# Altium footprint library ThanhNT.PcbLib: 579 footprints (part 10 of 37)
Each footprint in its own frame and in the unit in brackets; x right, y up, seen from the top. Pads: shape width x height; smd on the part's side, far side on the other; paste and mask are expansions set on the pad; w line width, h text height; cw(c..) or ccw(c..) is an arc to the next point about the centre after c.
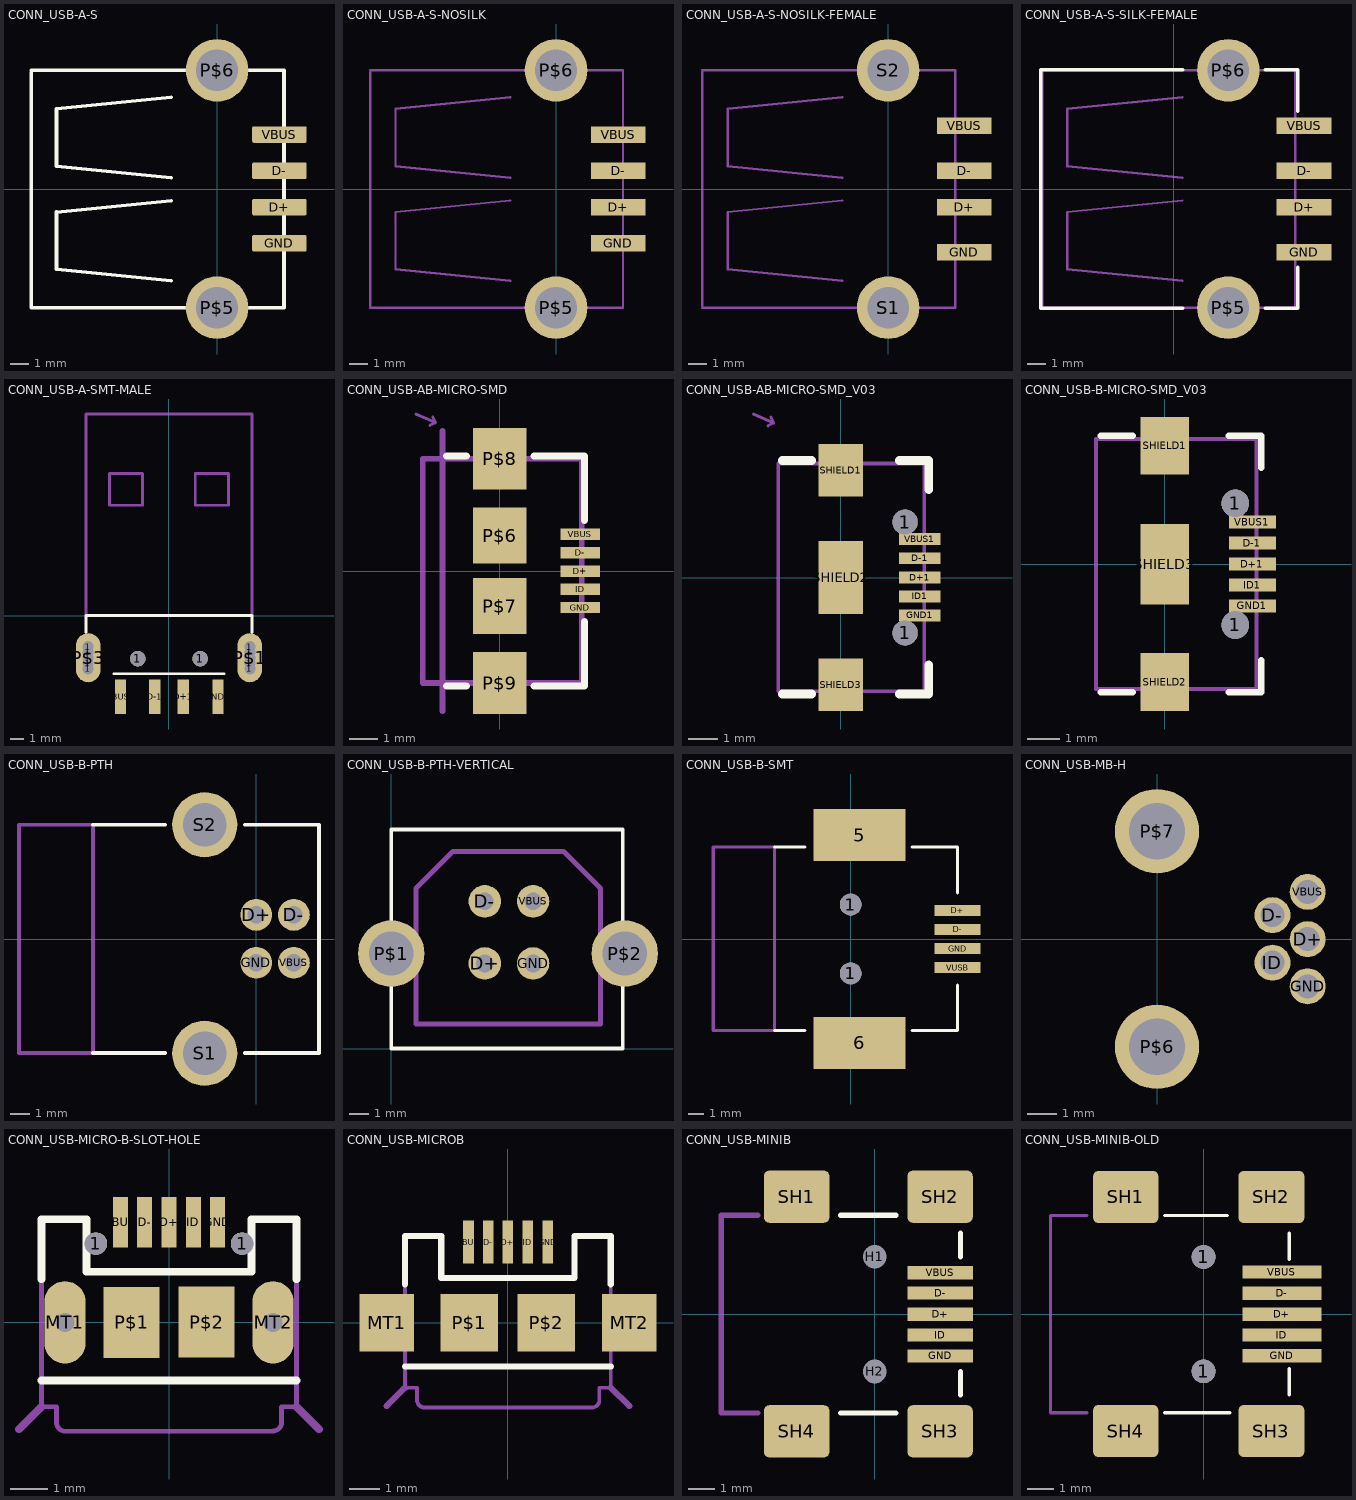
[diagram p9: the footprints below, top view; thin cyan lines are the x and y axes]

## CONN_USB-A-S [mil]
pads (6):
  rrect20% 119x36 smd: D+(136,-39.37) D-(136,40) GND(136,-118.11) VBUS(136,119)
  round 136.5 hole 91: P$5(0,-258.5) P$6(0,259)
Top Overlay:
  lines w7.87: -405,-258.5 146,-258.5 ; -405,-255 -405,255 ; -405,259 146,259 ; -100,-200 -350,-175 -350,-50 -100,-25 ; -100,25 -350,50 -350,175 -100,200 ; 146,-256 146,256

## CONN_USB-A-S-NOSILK [mil]
pads (6):
  rect 119x36 smd: D+(136,-39.37) D-(136,40) GND(136,-118.11) VBUS(136,119)
  round 136.5 hole 91: P$5(0,-258.5) P$6(0,259)
Mechanical 16:
  lines w5: -405,-258.5 146,-258.5 ; -405,-255 -405,255 ; -405,259 146,259 ; -100,-200 -350,-175 -350,-50 -100,-25 ; -100,25 -350,50 -350,175 -100,200 ; 146,-256 146,256

## CONN_USB-A-S-NOSILK-FEMALE [mil]
pads (6):
  rect 119x36 smd: D+(166,-39.37) D-(166,40) GND(166,-137.8) VBUS(166,138)
  round 136.5 hole 91: S1(0,-258.5) S2(0,259)
Mechanical 16:
  lines w5: -405,-258.5 146,-258.5 ; -405,-255 -405,255 ; -405,259 146,259 ; -100,-200 -350,-175 -350,-50 -100,-25 ; -100,25 -350,50 -350,175 -100,200 ; 146,-256 146,256

## CONN_USB-A-S-SILK-FEMALE [mil]
pads (6):
  rect 119x36 smd: D+(284,-39.37) D-(284,40) GND(284,-137.8) VBUS(284,138)
  round 136.5 hole 91: P$5(119,-258.5) P$6(119,259)
Top Overlay:
  lines w7.87: 20,-260 -290,-260 -290,260 20,260 ; 200,-260 270,-260 270,-170 ; 200,260 270,260 270,170
Mechanical 16:
  lines w5: -286.89,-258.5 264,-258.5 ; -286.89,-255 -286.89,255 ; -286.89,259 264,259 ; 19,-200 -231.89,-175 -231.89,-50 19,-25 ; 19,25 -231.89,50 -231.89,175 19,200 ; 265,-256 265,256

## CONN_USB-A-SMT-MALE [mil]
pads (16):
  round 32 hole 32: 1(-230.31,-151.57) 1(-230.31,-135.83) 1(-230.31,-104.33) 1(-230.31,-88.58) 1(231,-151.57) 1(231,-135.83) 1(231,-104.33) 1(231,-88.58)
  round 44 hole 44: 1(-88.58,-122.83) 1(89,-122.83)
  rect 32x99 smd: D+1(41,-231.1) D-1(-40.43,-231.1) GND1(140,-231.1) VBUS1(-137.8,-231.1)
  oval 70x140 hole 32: P$1(231,-120.08) P$3(-230.31,-120.08)
Top Overlay:
  lines w7.87: -236.22,-48.03 -236.22,0 237,0 237,-48.03 ; -157.48,-166.14 158,-166.14
Mechanical 16:
  lines w8: -236.22,0 -236.22,575 237,575 237,0 ; -169.29,315 -169.29,405 -74.8,405 -74.8,315 -169.29,315 ; 75,315 75,405 170,405 170,315 75,315
3D body "Samtec-USB-AM-S-F-B-SM1.STEP": height 157.95, standoff -66.46, extent -243.06,-241.85 249.07,573.11

## CONN_USB-AB-MICRO-SMD [mil]
pads (9):
  rect 56x16 smd: D+(113,0) D-(113,26) GND(113,-51.18) ID(113,-25.59) VBUS(113,52)
  rect 75x79 smd: P$6(0,50) P$7(0,-49.21)
  rect 75x87 smd: P$8(0,158) P$9(0,-157.48)
Top Overlay:
  lines w10: -74.8,-161.42 -47.24,-161.42 ; -74.8,162 -47.24,162 ; 48,-161.42 119,-161.42 119,-70.87 ; 48,162 119,162 119,71
Mechanical 16:
  lines w4: -118.11,221 -90.55,209 ; -98.43,205 -90.55,209 ; -94.49,217 -90.55,209
  lines w8: -108.27,-157.48 -108.27,158 ; -106.3,-157.48 115,-157.48 115,158 24,158 ; -106.3,158 -23.62,158 ; -80.71,-196.85 -80.71,197 ; -23.62,-157.48 -23.62,-181.1 24,-181.1 24,-157.48 ; -23.62,158 24,158 ; -23.62,158 -23.62,182 24,182 24,158
  text "PCB Front" at -204.72,217 h18.6
3D body "User Library-10104111.STEP": height 109.97, standoff -10.94, extent -107,-173.23 114.47,173.23

## CONN_USB-AB-MICRO-SMD_V03 [mil]
pads (10):
  round 34 hole 34: 1(87,-74.8) 1(87,75)
  rect 56x16 smd: D+1(107,0) D-1(107,26) GND1(107,-51.18) ID1(107,-25.59) VBUS1(107,52)
  rect 60x71 smd: SHIELD1(0,145) SHIELD3(0,-144.88)
  rect 60x99 smd: SHIELD2(0,0)
Top Overlay:
  lines w12: -78.74,-157.48 -39.37,-157.48 ; -78.74,158 -39.37,158 ; 79,-157.48 119,-157.48 119,-118.11 ; 79,158 118,158 ; 119,119 119,158
Top Paste:
  rectangle: -29.53,110 30,181
  rectangle: -13.78,-29.53 14,30
  rectangle: -29.53,-180.47 30,-109.61
Top Solder:
  rectangle: -33.46,106 34,185
  rectangle: -33.46,-184.41 34,-105.67
  rectangle: -33.46,-53.15 34,54
Mechanical 14:
  lines w5: -84.65,-153.54 -84.65,154 113,154 113,-153.54 -84.65,-153.54
Mechanical 16:
  lines w4: -118.11,221 -90.55,209 ; -98.43,205 -90.55,209 ; -94.49,217 -90.55,209
  text "PCB Front" at -183.46,235 h18.6

## CONN_USB-B-MICRO-SMD_V03 [mil]
pads (10):
  round 34 hole 34: 1(87,-74.8) 1(87,75)
  rect 58x16 smd: D+1(108,0) D-1(108,26) GND1(108,-51.18) ID1(108,-25.59) VBUS1(108,52)
  rect 60x71 smd: SHIELD1(0,146) SHIELD2(0,-145.08)
  rect 60x99 smd: SHIELD3(0,0)
Top Overlay:
  lines w7.87: -78.74,-157.48 -39.37,-157.48 ; -78.74,158 -39.37,158 ; 79,-157.48 119,-157.48 119,-118.11 ; 79,158 118,158 ; 119,119 119,158
Top Paste:
  rectangle: -29.53,110 30,181
  rectangle: -13.78,-29.53 14,30
  rectangle: -29.53,-180.47 30,-109.61
Top Solder:
  rectangle: -33.46,106 34,185
  rectangle: -33.46,-184.41 34,-105.67
  rectangle: -33.46,-53.15 34,54
Mechanical 14:
  lines w5: -84.65,-153.54 -84.65,154 113,154 113,-153.54 -84.65,-153.54

## CONN_USB-B-PTH [mil]
pads (6):
  round 66 hole 36: D+(0,50) D-(78,50) GND(0,-49.21) VBUS(78,-49.21)
  round 135 hole 90: S1(-107,-237) S2(-107,237)
Top Overlay:
  lines w7.87: -338.58,-236.22 -188.98,-236.22 ; -338.58,237 -188.98,237 ; -23.62,-236.22 130,-236.22 130,237 -23.62,237
Mechanical 16:
  lines w8: -492.13,-236.22 -492.13,237 -338.58,237 -338.58,-236.22 -492.13,-236.22
3D body "usb_a-usbsb.stp": height 421.26, standoff -155.51, extent -515,-296.31 134.61,290.31

## CONN_USB-B-PTH-VERTICAL [mil]
pads (6):
  round 66 hole 36: D+(190,173) D-(190,299) GND(288,173) VBUS(288,299)
  round 135 hole 90: P$1(0,193) P$2(474,193)
Top Overlay:
  lines w7.87: 0,0 470,0 470,445 0,445 0,0
Mechanical 16:
  lines w10: 50,50 425,50 425,325 350,400 125,400 50,325 50,50

## CONN_USB-B-SMT [mil]
pads (8):
  round 56 hole 56: 1(0,-88.58) 1(0,89)
  rect 238x134 smd: 5(23,268) 6(23,-267.72)
  rect 119x28 smd: D+(276,74) D-(276,25) GND(276,-24.61) VUSB(276,-73.82)
Top Overlay:
  lines w8: -196.85,-236.22 -118.11,-236.22 ; -196.85,237 -118.11,237 ; 158,-236.22 276,-236.22 276,-118.11 ; 158,237 276,237 276,119
Mechanical 16:
  lines w8: -354.33,-236.22 -196.85,-236.22 -196.85,237 -354.33,237 -354.33,-236.22 ; -39.37,-287.4 -31.5,-295.28 -19.68,-295.28 0,-275.59 56,-275.59 75,-295.28 87,-295.28 95,-287.4 95,-236.22 -39.37,-236.22 -39.37,-287.4 ; -39.37,237 -39.37,288 -31.5,296 -19.68,296 0,276 56,276 75,296 87,296 95,288 95,237 -39.37,237

## CONN_USB-MB-H [mil]
pads (7):
  round 48 hole 32: D+(201,0) D-(154,32) GND(201,-62.99) ID(154,-31.5) VBUS(201,63)
  round 112.5 hole 75: P$6(0,-143.7) P$7(0,144)
Bottom Overlay:
  lines w5: -127.95,-49.21 69,-29.53 69,30 -127.95,50 ; 30,60 -127.95,79 -127.95,119 30,138 ; 50,-137.8 -127.95,-118.11 -127.95,-78.74 50,-59.06 ; -147.64,-153.54 -147.64,154 207,154 207,-153.54 -147.64,-153.54

## CONN_USB-MICRO-B-SLOT-HOLE [mm]
pads (11):
  round 0.6 hole 0.6: 1(-1.95,2.1) 1(1.95,2.1)
  rect 0.4x1.35 smd: D+(0,2.675) D-(-0.65,2.675) GND(1.3,2.675) ID(0.65,2.675) VBUS(-1.3,2.675)
  oval 1.1x2.2 hole 0.5: MT1(-2.775,0) MT2(2.775,0)
  rect 1.5x1.9 smd: P$1(-1,0) P$2(1,0.01)
Top Overlay:
  lines w0.203: -3.4,-1.55 3.4,-1.55 ; -3.4,1.15 -3.4,2.75 -2.2,2.75 -2.2,1.35 2.2,1.35 2.2,2.75 3.4,2.75 3.4,1.15
Mechanical 11:
  lines w0: -3.03,-0.35 ccw(c-2.78,-0.35) -2.78,-0.6 ccw(c-2.78,-0.34) -2.52,-0.34 -2.52,0.34 ccw(c-2.78,0.34) -2.78,0.6 ccw(c-2.78,0.35) -3.03,0.35 -3.03,-0.35 ; 2.505,-0.35 ccw(c2.755,-0.35) 2.755,-0.6 ccw(c2.755,-0.34) 3.015,-0.34 3.015,0.34 ccw(c2.755,0.34) 2.755,0.6 ccw(c2.755,0.35) 2.505,0.35 2.505,-0.35
Mechanical 16:
  lines w0.127: -3.4,-1.55 -3.4,-2.25 -3,-2.25 -3,-2.65 ccw(c-2.763,-2.665) -2.8,-2.9 2.75,-2.9 ccw(c2.765,-2.663) 3,-2.7 3,-2.25 3.4,-2.25 3.4,-1.55 ; -3.4,-1.55 -3.4,2.75 -2.2,2.75 -2.2,1.35 2.2,1.35 2.2,2.75 3.4,2.75 3.4,-1.55 ; -3.4,-1.55 3.4,-1.55
  lines w0.203: -4,-2.85 -3.4,-2.25 ; 3.4,-2.25 4,-2.85

## CONN_USB-MICROB [mil]
pads (9):
  rect 14x56 smd: D+(0,105) D-(-25.59,105) GND(52,105) ID(26,105) VBUS(-51.18,105)
  rect 71x75 smd: MT1(-157.48,0) MT2(158,0)
  rect 75x75 smd: P$1(-50,0) P$2(50,0)
Top Overlay:
  lines w8: -133.86,-57.09 134,-57.09 ; -133.86,50 -133.86,113 -86.61,113 -86.61,58 87,58 87,113 134,113 134,50
Mechanical 16:
  lines w5: -133.86,-57.09 134,-57.09 ; -133.86,-57.09 -133.86,113 -86.61,113 -86.61,58 87,58 87,113 134,113 134,-57.09 ; -133.86,-57.09 -133.86,-84.65 -118.11,-84.65 -118.11,-100.39 ccw(c-108.76,-100.98) -110.24,-110.24 109,-110.24 ccw(c109.67,-100.8) 119,-102.36 119,-84.65 134,-84.65 134,-57.09
  lines w8: -157.48,-108.27 -133.86,-84.65 ; 134,-84.65 158,-108.27

## CONN_USB-MINIB [mil]
pads (11):
  rect 99x20 smd: D+(99,0) D-(99,32) GND(99,-62.99) ID(99,-31.5) VBUS(99,63)
  round 32 hole 36: H1(0,87)
  round 31 hole 36: H2(0,-86.61)
  rrect20% 99x79 smd: SH1(-118.11,178) SH2(99,178) SH3(99,-177.17) SH4(-118.11,-177.17)
Top Overlay:
  lines w8: -51.18,-149.61 32,-149.61 ; -51.18,150 32,150 ; 130,-122.05 130,-86.61 ; 130,87 130,123
Top Solder:
  circle w17: c0,87 r14
  circle w17: c0,-86.61 r14
Mechanical 16:
  lines w8: -177.17,-149.61 -232.28,-149.61 -232.28,150 -177.17,150
3D body "User Library-usb_mini_smd.STEP": height 163.42, standoff -36.9, extent -231.2,-194.88 131,194.88

## CONN_USB-MINIB-OLD [mil]
pads (11):
  round 36 hole 36: 1(0,-86.61) 1(0,87)
  rect 120x20 smd: D+(119,0) D-(119,32) GND(119,-62.99) ID(119,-31.5) VBUS(119,64)
  rrect20% 99x79 smd: SH1(-118.11,178) SH4(-118.11,-177.17)
  rrect20% 100x79 smd: SH2(103,178) SH3(103,-177.17)
Top Overlay:
  lines w5: -59.06,-149.61 40,-149.61 ; -59.06,150 36,150 ; 130,-122.05 130,-82.68 ; 130,83 130,123
Mechanical 16:
  lines w5: -177.17,-149.61 -232.28,-149.61 -232.28,150 -177.17,150
3D body "User Library-usb_mini_smd.STEP": height 163.42, standoff -36.9, extent -233,-195.88 129.2,193.88